# Altium footprint library PcbLib1.PcbLib: 45 footprints (part 3 of 3)
Each footprint in its own frame and in the unit in brackets; x right, y up, seen from the top. Pads: shape width x height; smd on the part's side, far side on the other; paste and mask are expansions set on the pad; w line width, h text height; cw(c..) or ccw(c..) is an arc to the next point about the centre after c.
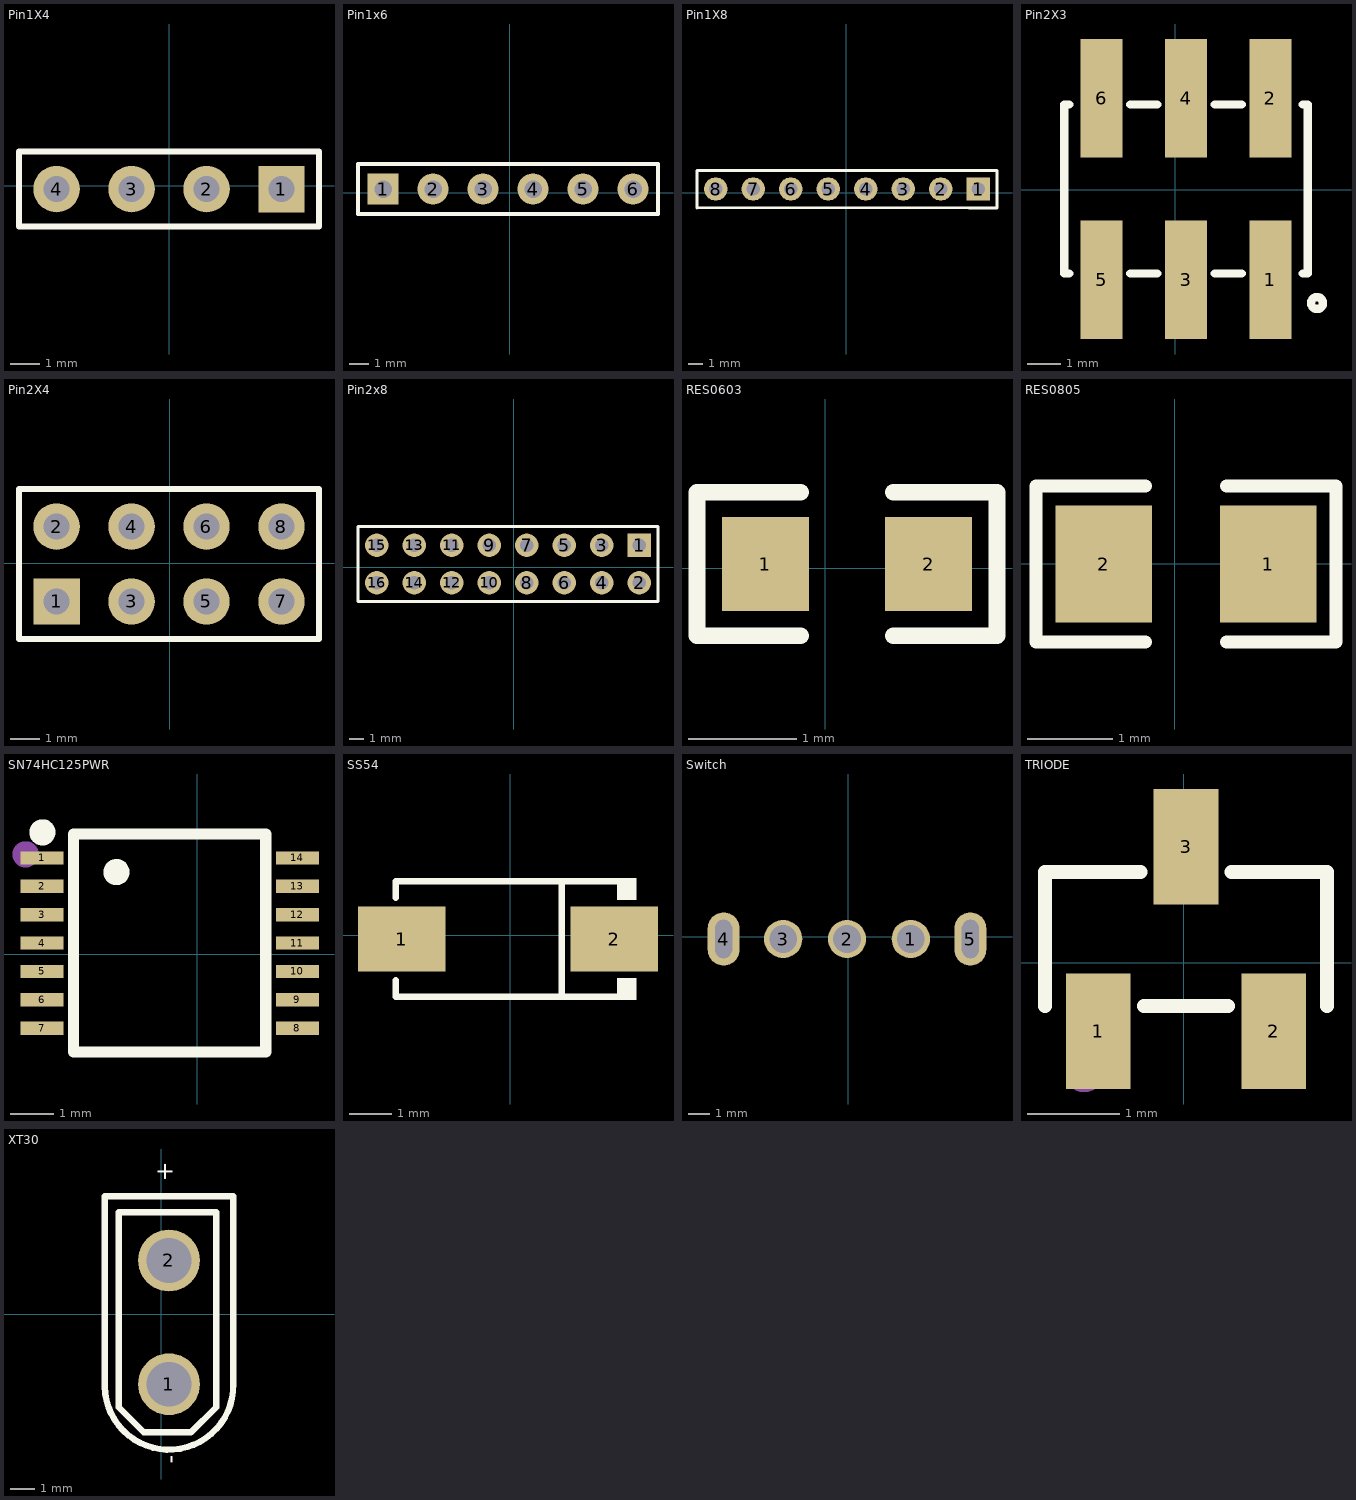
[diagram p2: the footprints below, top view; thin cyan lines are the x and y axes]

## Pin1X4 [mil]
pads (4):
  rect 62x62 hole 35: 1(149.41,-4.14)
  round 62 hole 35: 2(49.41,-4.14) 3(-50.59,-4.14) 4(-150.59,-4.14)
Top Overlay:
  lines w7.99: -200.59,-54.14 124.41,-54.14
  lines w8: -200.59,-54.14 -200.59,45.86 199.41,45.86 199.41,-54.14 124.41,-54.14
3D body "J14.step": height 334.65, standoff -118.11, extent -204.99,-54.14 195.01,45.86

## Pin1x6 [mil]
pads (6):
  rect 62x62 hole 35: 1(-253.74,7.86)
  round 62 hole 35: 2(-153.74,7.86) 3(-53.74,7.86) 4(46.26,7.86) 5(146.26,7.86) 6(246.26,7.86)
Top Overlay:
  lines w7.99: -228.74,57.86 296.26,57.86
  lines w8: -228.74,57.86 -303.74,57.86 -303.74,-42.14 296.26,-42.14 296.26,57.86
3D body "J15.step": height 334.65, standoff -118.11, extent -304.99,-44.99 295.04,55.01
3D body: height 10, standoff 0, extent 0,125 0,125

## Pin1X8 [mil]
pads (8):
  rect 62x62 hole 35: 1(352,10)
  round 62 hole 35: 2(252,10) 3(152,10) 4(52,10) 5(-48,10) 6(-148,10) 7(-248,10) 8(-348,10)
Top Overlay:
  lines w7.99: -398,-40 327,-40
  lines w8: -398,-40 -398,60 402,60 402,-40 327,-40
3D body "H1.step": height 332.76, standoff -120, extent -395,-40 405,60

## Pin2X3 [mil]
pads (6):
  rect 50x140.16 smd: 1(113,-106.48) 2(113,108.48) 3(13,-106.48) 4(13,108.48) 5(-87,-106.48) 6(-87,108.48)
Top Overlay:
  circle w10: c168,-134 r7.07
  lines w10: -125.04,-99 -130.94,-99 -130.94,101 -125.04,101 ; -52.9,-99 -21.1,-99 ; -52.9,101 -21.1,101 ; 47.1,-99 78.9,-99 ; 47.1,101 78.9,101 ; 151.04,-99 156.94,-99 156.94,101 151.04,101
3D body "H2.step": height 533.86, standoff 0, extent -135.39,-152.79 165.01,122.8

## Pin2X4 [mil]
pads (8):
  rect 62x62 hole 35: 1(-151,-51)
  round 62 hole 35: 2(-151,49) 3(-51,-51) 4(-51,49) 5(49,-51) 6(49,49) 7(149,-51) 8(149,49)
Top Overlay:
  lines w8: -201,-101 -201,99 199,99 199,-101 -201,-101
3D body "J13.step": height 332.76, standoff -120, extent -199.99,-99.99 200.04,100.01

## Pin2x8 [mil]
pads (16):
  rect 62x62 hole 35: 1(335,59)
  round 62 hole 35: 2(335,-41) 3(235,59) 4(235,-41) 5(135,59) 6(135,-41) 7(35,59) 8(35,-41) 9(-65,59) 10(-65,-41) 11(-165,59) 12(-165,-41) 13(-265,59) 14(-265,-41) 15(-365,59) 16(-365,-41)
Top Overlay:
  lines w8: -415,-91 385,-91 385,109 -415,109 -415,-91
3D body "J12.step": height 332.76, standoff -120, extent -414.99,-94.99 385.4,105.01

## RES0603 [mil]
pads (2):
  rect 31.75x34.02 smd: 1(-21.8,1.59) 2(37.51,1.59)
Top Overlay:
  lines w6: -8.92,-24.42 -46.67,-24.42 -46.67,27.6 -8.92,27.6 ; 24.64,-24.42 62.39,-24.42 62.39,27.6 24.64,27.6
Top Paste:
  region: 54.91,19.31 23.41,19.31 21.44,17.34 21.44,8.36 36.01,8.36 36.01,-4.63 21.44,-4.63 21.44,-14.16 23.41,-16.13 54.91,-16.13 56.87,-14.16 56.87,17.34
  region: -6.12,17.34 -6.12,8.36 -21.08,8.36 -21.08,-4.63 -6.12,-4.63 -6.12,-14.16 -8.09,-16.13 -39.19,-16.13 -41.16,-14.16 -41.16,17.34 -39.19,19.31 -8.09,19.31
3D body "R17.step": height 31.5, standoff 0, extent -21.49,-15.74 41.5,15.75

## RES0805 [mil]
pads (2):
  rect 44.59x54.21 smd: 1(43.14,-0.2) 2(-32.94,-0.2)
Top Overlay:
  lines w6: -13.65,-36.31 -64.24,-36.31 -64.24,35.91 -13.65,35.91 ; 23.85,-36.31 74.44,-36.31 74.44,35.91 23.85,35.91
Top Paste:
  region: -12.62,25 -12.62,8.46 -30.14,8.46 -30.14,-9.25 -12.81,-9.25 -12.62,-25.4 -14.59,-27.36 -59.86,-27.36 -61.83,-25.4 -61.83,25 -59.86,26.97 -14.59,26.97
  region: 72.03,25 72.03,-25.4 70.06,-27.36 24.79,-27.36 22.82,-25.4 22.62,-9.25 40.34,-9.25 40.34,8.46 23.01,8.46 22.82,25 24.79,26.97 70.06,26.97
3D body "RES0805.step": height 24.02, standoff 0, extent -36.56,-24.88 42.18,26.34

## SN74HC125PWR [mil]
pads (14):
  rect 39x12 smd: 1(-139.92,86.77) 2(-139.92,61.18) 3(-139.92,35.59) 4(-139.92,10) 5(-139.92,-15.59) 6(-139.92,-41.18) 7(-139.92,-66.77) 8(90.39,-66.77) 9(90.39,-41.18) 10(90.39,-15.59) 11(90.39,10) 12(90.39,35.59) 13(90.39,61.18) 14(90.39,86.77)
Top Overlay:
  circle w11.81: c-72.76,74 r5.91
  circle w11.81: c-139.6,109.85 r5.91
  lines w10: -111.38,-88.42 61.85,-88.42 61.85,108.43 -111.38,108.43 -111.38,-88.42
Mechanical 15:
  circle w11.81: c-154.76,90 r5.91
3D body "U6.step": height 43.31, standoff 0, extent -143.35,-88.43 93.36,108.42

## SS54 [mil]
pads (2):
  rect 81.2x60.59 smd: 1(-100.77,-3.33) 2(96.37,-3.33)
Top Overlay:
  region: 98.98,-59.72 98.98,-39.62 116.98,-39.62 116.98,-59.72
  region: 98.98,53.07 98.98,32.97 116.98,32.97 116.98,53.07
  lines w6: -106.38,-41.62 -106.38,-56.72 101.98,-56.72 ; -106.38,34.97 -106.38,50.07 101.98,50.07 ; 47.77,-56.72 47.77,50.07
Mechanical 15:
  region: 91.42,0.45 91.42,-7.11 61.19,-7.11 61.19,0.45
  region: -95.82,0.45 -95.82,-7.11 -65.59,-7.11 -65.59,0.45
  region: -84.48,21.87 -84.48,-28.52 -76.92,-28.52 -76.92,21.87
3D body "SS54.step": height 82.68, standoff 0, extent -100.37,-57.62 104.36,52.61

## Switch [mm]
pads (5):
  round 1.8 hole 1.3: 1(2.93,-0.107) 2(-0.07,-0.107) 3(-3.07,-0.107)
  oval 1.5x2.5 hole 0.8 slot 1.8 at 90 deg: 4(-5.87,-0.107) 5(5.73,-0.107)
Bottom Overlay:
  lines w0.254: -6.07,-1.567 -6.07,-2.907 5.93,-2.907 5.93,-1.567 ; -6.07,1.354 -6.07,2.693 5.93,2.693 5.93,1.354 ; -3.88,-0.895 -3.88,-2.139 3.486,-2.139 3.486,-1.091 ; -3.88,0.682 -3.88,1.925 3.486,1.925 3.486,0.878 ; -0.07,-1.238 -0.07,-1.631 2.978,-1.631 2.978,-1.237 ; -0.07,1.024 -0.07,1.417 2.978,1.417 2.978,1.023 ; 0.472,-1.631 0.472,-1.099 ; 0.955,-1.631 0.955,-0.581 ; 0.955,0.367 0.955,1.417 ; 1.454,-1.631 1.454,1.417 ; 1.971,-1.631 1.971,-0.705 ; 1.971,0.492 1.971,1.417 ; 2.479,-1.631 2.479,-1.144 ; 2.479,0.931 2.479,1.417
3D body "Switch.step": height 11.31, standoff -3.6, extent -6.119,-3.272 5.979,3.059

## TRIODE [mm]
pads (3):
  rect 0.7x1.25 smd: 1(-0.927,-0.744) 2(0.973,-0.744) 3(0.023,1.256)
Top Overlay:
  lines w0.152: -1.503,-0.471 -1.503,0.982 -0.471,0.982 ; -0.432,-0.471 0.479,-0.471 ; 0.518,0.982 1.549,0.982 1.549,-0.471
Mechanical 15:
  circle w0.2: c-1.077,-1.204 r0.1
3D body "Q2.step": height 1.05, standoff 0, extent -1.423,-0.996 1.47,1.504

## XT30 [mm]
pads (2):
  round 2.5 hole 1.8: 1(0.305,-2.822) 2(0.305,2.178)
Top Overlay:
  lines w0.254: -2.295,-2.919 ccw(c0.305,-2.866) 2.905,-2.828 2.905,4.778 -2.295,4.778 -2.295,-2.919 ; -1.727,-3.751 -0.711,-4.767 1.194,-4.767 2.21,-3.751 2.21,4.123 -1.727,4.123 -1.727,-3.751
  text "-" at 0.686,-6.045 h0.71
  text "+" at 0.459,5.365 h0.71
3D body "CN4.step": height 10.7, standoff -2, extent -2.295,-5.354 2.905,4.846
3D body: height 0.25, standoff 0, extent 5.842,-0.381 5.842,-0.381
3D body: height 0.25, standoff 0, extent 5.842,-0.381 5.842,-0.381
3D body: height 0.25, standoff 0, extent 5.842,-0.381 5.842,-0.381